# Altium footprint library Conectores GAM.PcbLib: 182 footprints (part 8 of 12)
Each footprint in its own frame and in the unit in brackets; x right, y up, seen from the top. Pads: shape width x height; smd on the part's side, far side on the other; paste and mask are expansions set on the pad; w line width, h text height; cw(c..) or ccw(c..) is an arc to the next point about the centre after c.
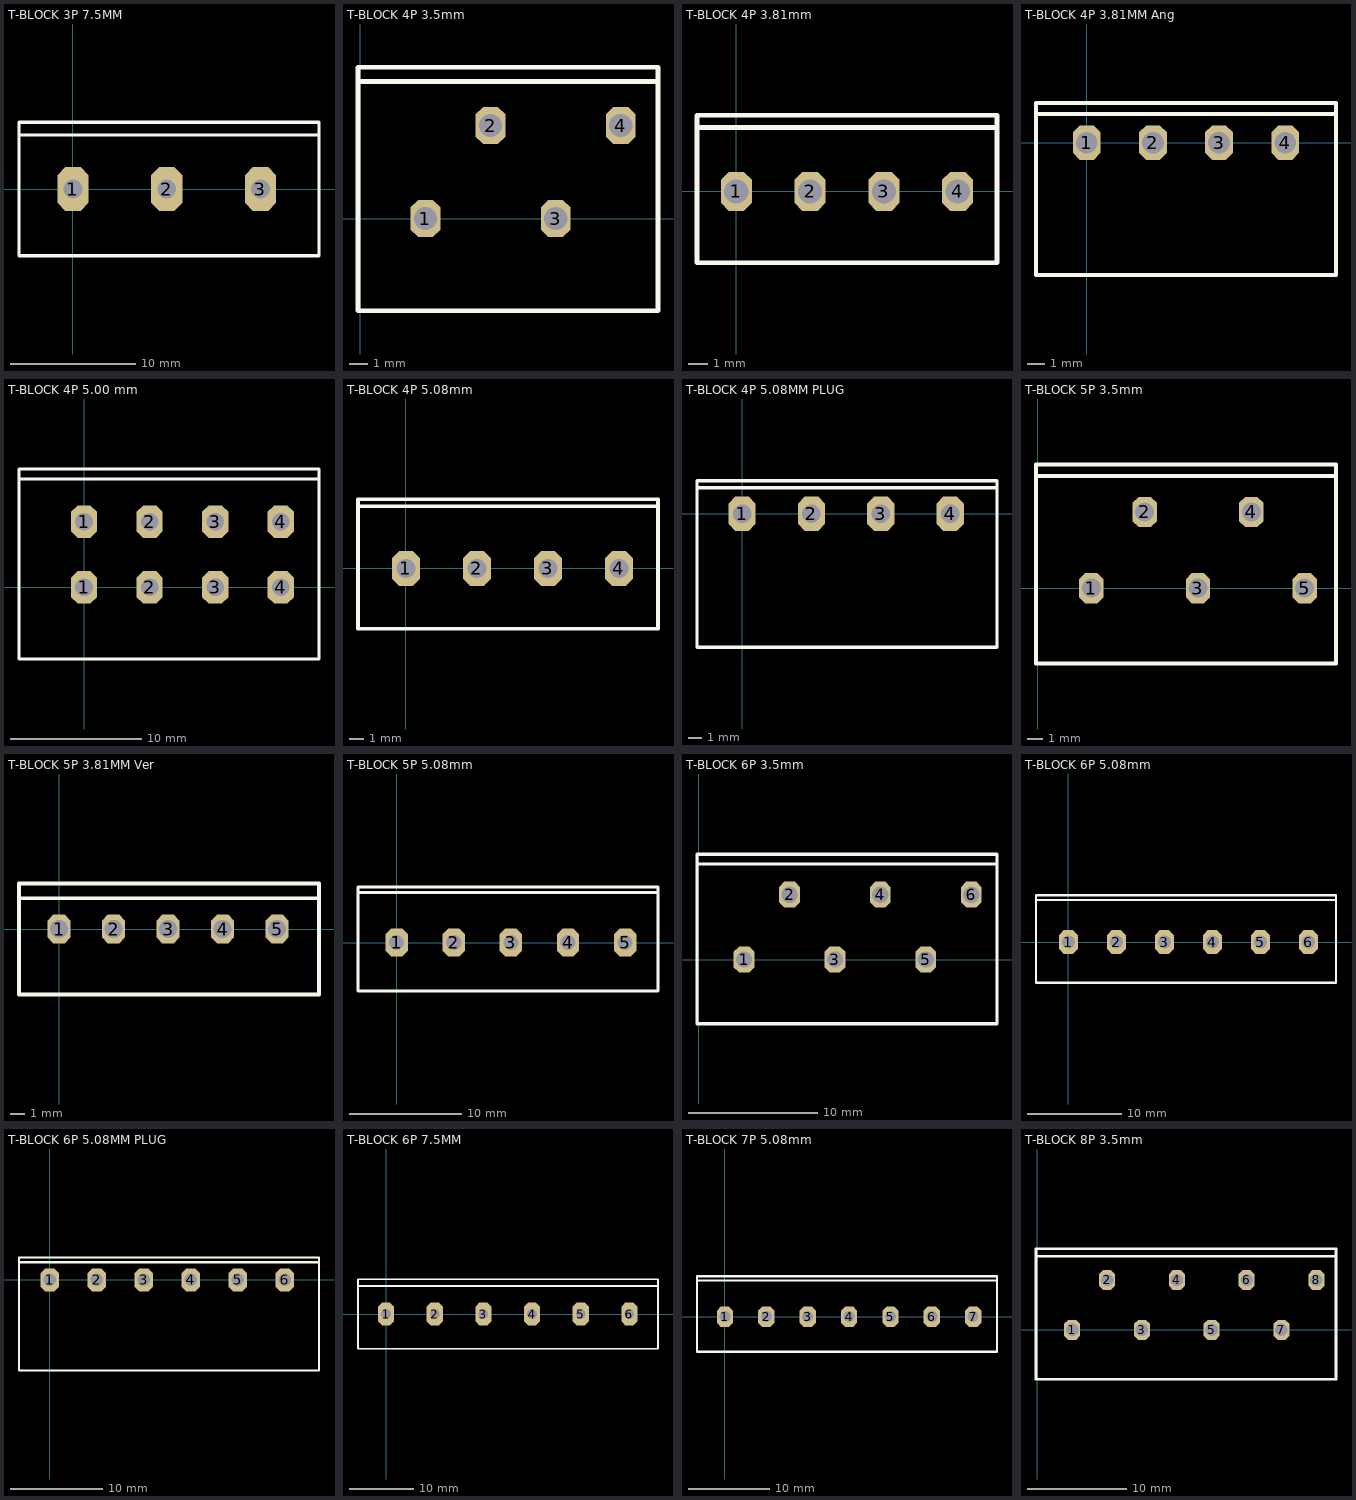
[diagram p7: the footprints below, top view; thin cyan lines are the x and y axes]

## T-BLOCK 3P 7.5MM [mm] "Terminal de Bloque 3P 7.5 mm"
pads (3):
  oct 2.5x3.5 hole 1.5: 1(0,0) 2(7.5,0) 3(15,0)
Top Overlay:
  lines w0.254: -4.191,4.318 19.685,4.318 ; -4.318,-5.334 19.685,-5.334 19.685,5.334 -4.318,5.334 -4.318,-5.334
3D body "Tblock75x3.stp": height 11.8, standoff -3.3, extent -3.75,-3.944 18.75,3.556

## T-BLOCK 4P 3.5mm [mm] "Terminal Block 4P 3.5mm"
pads (4):
  oct 1.6x2 hole 1.25: 1(3.5,0) 2(7,5) 3(10.5,0) 4(14,5)
Top Overlay:
  lines w0.254: -0.127,7.366 16.002,7.366 ; -0.127,-4.953 -0.127,8.128 16.002,8.128 16.002,-4.953 -0.127,-4.953
3D body "TB3.5MM-W691412120004B (rev1).stp": height 13.05, standoff -3.25, extent 0.179,-4.73 15.679,7.27

## T-BLOCK 4P 3.81mm [mm] "Terminal de Bloque 4P 3.81mm"
pads (4):
  oct 1.6x2 hole 1.25: 1(0,0) 2(3.81,0) 3(7.62,0) 4(11.43,0)
Top Overlay:
  lines w0.254: -2.032,3.302 13.462,3.302 ; -2.032,-3.683 -2.032,3.937 13.462,3.937 13.462,-3.683 -2.032,-3.683
3D body "TB381X2.stp": height 8.7, standoff -3.3, extent -1.905,-3.617 5.715,3.683
3D body "TB381X2.stp": height 8.7, standoff -3.3, extent 5.715,-3.617 13.335,3.683

## T-BLOCK 4P 3.81MM Ang [mm] "TERMINAL BLOCK 3.81MM 4P"
pads (4):
  oct 1.6x2 hole 1.25: 1(0,0) 2(3.81,0) 3(7.62,0) 4(11.43,0)
Top Overlay:
  lines w0.254: -2.794,1.651 14.351,1.651 ; -2.921,-7.62 14.351,-7.62 14.351,2.286 -2.921,2.286 -2.921,-7.62
3D body "TB 3.81 3Pa.stp": height 7.8, standoff -3.3, extent -2.286,-17.883 9.144,-2.183
3D body "ph-tb3-381.stp": height 7.25, standoff -3.4, extent -2.6,-7.903 10.22,1.397
3D body "ph-tb3-381.stp": height 7.25, standoff -3.4, extent 1.21,-7.903 14.03,1.397
3D body "TB 3.81 3Pa.stp": height 7.8, standoff -3.3, extent 2.286,-17.883 13.716,-2.183

## T-BLOCK 4P 5.00 mm [mm] "Terminal de Bloque 4P 5mm TE 1-2834014-4"
pads (8):
  oct 2x2.5 hole 1.35: 1(0,0) 1(0,5) 2(5,0) 2(5,5) 3(10,0) 3(10,5) 4(15,0) 4(15,5)
Top Overlay:
  lines w0.254: -4.953,8.255 17.78,8.255 ; -4.953,-5.461 17.907,-5.461 17.907,9.017 -4.953,9.017 -4.953,-5.461
3D body "c-1-2834014-4-1-3d.stp": height 13.35, standoff -3.05, extent -4.523,-5.18 17.477,7.62

## T-BLOCK 4P 5.08mm [mm] "Terminal Block 4P 5.08mm"
pads (4):
  oct 2x2.5 hole 1.35: 1(0,0) 2(5.08,0) 3(10.16,0) 4(15.24,0)
Top Overlay:
  lines w0.254: -3.302,4.445 17.907,4.445 ; -3.429,-4.318 18.034,-4.318 18.034,4.953 -3.429,4.953 -3.429,-4.318
3D body "tb1p.step": height 12.5, standoff -4.4, extent 12.1,-4.119 17.78,4.881
3D body "tb1p.step": height 12.5, standoff -4.4, extent 7.02,-4.119 12.7,4.881
3D body "tb1p.step": height 12.5, standoff -4.4, extent 1.94,-4.119 7.62,4.881
3D body "tb1p.step": height 12.5, standoff -4.4, extent -3.14,-4.119 2.54,4.881

## T-BLOCK 4P 5.08MM PLUG [mm] "Terminal de Bloque 4P 5.08mm 90"
pads (4):
  oct 2x2.5 hole 1.35: 1(0,0) 2(5.08,0) 3(10.16,0) 4(15.24,0)
Top Overlay:
  lines w0.254: -3.175,1.905 18.669,1.905 ; -3.302,-9.779 18.669,-9.779 18.669,2.413 -3.302,2.413 -3.302,-9.779
3D body "TB PlugIn 5.08mm 2PF.step": height 15.75, standoff -3.75, extent -3.26,-19.341 8.34,2.159
3D body: height 0.25, standoff 0, extent 0.127,2.159 0.127,2.159
3D body "TB PlugIn 5.08mm 2PF.step": height 15.75, standoff -3.75, extent 6.9,-19.341 18.5,2.159

## T-BLOCK 5P 3.5mm [mm] "Terminal Block 5P 3.5mm"
pads (5):
  oct 1.6x2 hole 1.25: 1(3.5,0) 2(7,5) 3(10.5,0) 4(14,5) 5(17.5,0)
Top Overlay:
  lines w0.254: -0.127,7.366 19.558,7.366 ; -0.127,-4.953 19.558,-4.953 19.558,8.128 -0.127,8.128 -0.127,-4.953
3D body "TB3.5MM-W691412120005B (rev1).stp": height 13.05, standoff -3.25, extent 0.179,-4.73 19.179,7.27

## T-BLOCK 5P 3.81MM Ver [mm] "TERMINAL BLOCK 3.81MM 5P 691321300005"
pads (5):
  oct 1.6x2 hole 1.25: 1(0,0) 2(3.81,0) 3(7.62,0) 4(11.43,0) 5(15.24,0)
Top Overlay:
  lines w0.254: -2.794,2.159 18.034,2.159 ; -2.794,-4.572 18.161,-4.572 18.161,3.175 -2.794,3.175 -2.794,-4.572
3D body "691321300005 (rev1).stp": height 9.6, standoff -3.1, extent -2.413,-4.362 17.827,2.838

## T-BLOCK 5P 5.08mm [mm] "Terminal Block 5P 5.08mm"
pads (5):
  oct 2x2.5 hole 1.35: 1(0,0) 2(5.08,0) 3(10.16,0) 4(15.24,0) 5(20.32,0)
Top Overlay:
  lines w0.254: -3.302,4.445 23.241,4.445 ; -3.429,-4.318 -3.429,4.953 23.241,4.953 23.241,-4.318 -3.429,-4.318
3D body "tb1p.step": height 12.5, standoff -4.4, extent -3.14,-4.119 2.54,4.881
3D body "tb1p.step": height 12.5, standoff -4.4, extent 1.94,-4.119 7.62,4.881
3D body "tb1p.step": height 12.5, standoff -4.4, extent 7.02,-4.119 12.7,4.881
3D body "tb1p.step": height 12.5, standoff -4.4, extent 12.1,-4.119 17.78,4.881
3D body "tb1p.step": height 12.5, standoff -4.4, extent 17.18,-4.119 22.86,4.881

## T-BLOCK 6P 3.5mm [mm] "Terminal Block 6P 3.5mm"
pads (6):
  oct 1.6x2 hole 1.25: 1(3.5,0) 2(7,5) 3(10.5,0) 4(14,5) 5(17.5,0) 6(21,5)
Top Overlay:
  lines w0.254: -0.127,7.366 22.987,7.366 ; -0.127,-4.953 -0.127,8.128 22.987,8.128 22.987,-4.953 -0.127,-4.953
3D body "TB3.5MM-W691412120006B (rev1).stp": height 13.05, standoff -3.25, extent 0.179,-4.73 22.679,7.27

## T-BLOCK 6P 5.08mm [mm] "Terminal Block 6P 5.08mm"
pads (6):
  oct 2x2.5 hole 1.35: 1(0,0) 2(5.08,0) 3(10.16,0) 4(15.24,0) 5(20.32,0) 6(25.4,0)
Top Overlay:
  lines w0.254: -3.302,4.445 28.321,4.445 ; -3.429,-4.318 -3.429,4.953 28.321,4.953 28.321,-4.318 -3.429,-4.318
3D body "tb1p.step": height 12.5, standoff -4.4, extent -3.14,-4.119 2.54,4.881
3D body "tb1p.step": height 12.5, standoff -4.4, extent 1.94,-4.119 7.62,4.881
3D body "tb1p.step": height 12.5, standoff -4.4, extent 7.02,-4.119 12.7,4.881
3D body "tb1p.step": height 12.5, standoff -4.4, extent 12.1,-4.119 17.78,4.881
3D body "tb1p.step": height 12.5, standoff -4.4, extent 17.18,-4.119 22.86,4.881
3D body "tb1p.step": height 12.5, standoff -4.4, extent 22.26,-4.119 27.94,4.881

## T-BLOCK 6P 5.08MM PLUG [mm] "Terminal de Bloque 6P 5.08mm 90"
pads (6):
  oct 2x2.5 hole 1.35: 1(0,0) 2(5.08,0) 3(10.16,0) 4(15.24,0) 5(20.32,0) 6(25.4,0)
Top Overlay:
  lines w0.254: -3.175,1.905 29.083,1.905 ; -3.302,-9.779 29.083,-9.779 29.083,2.413 -3.302,2.413 -3.302,-9.779
3D body "TB PlugIn 5.08mm 2PF.step": height 15.75, standoff -3.75, extent -3.26,-19.341 8.34,2.159
3D body: height 0.25, standoff 0, extent 0.127,2.159 0.127,2.159
3D body "TB PlugIn 5.08mm 2PF.step": height 15.75, standoff -3.75, extent 6.9,-19.341 18.5,2.159
3D body "TB PlugIn 5.08mm 2PF.step": height 15.75, standoff -3.75, extent 17.06,-19.341 28.66,2.159

## T-BLOCK 6P 7.5MM [mm] "Terminal de Bloque 6P 7.5 mm"
pads (6):
  oct 2.5x3.5 hole 1.5: 1(0,0) 2(7.5,0) 3(15,0) 4(22.5,0) 5(30,0) 6(37.5,0)
Top Overlay:
  lines w0.254: -4.191,4.318 41.91,4.318 ; -4.318,-5.334 41.91,-5.334 41.91,5.334 -4.318,5.334 -4.318,-5.334
3D body "Tblock75x6.stp": height 11.8, standoff -3.3, extent -3.75,-3.944 41.25,3.556

## T-BLOCK 7P 5.08mm [mm] "Terminal Block 7P 5.08mm"
pads (7):
  oct 2x2.5 hole 1.35: 1(0,0) 2(5.08,0) 3(10.16,0) 4(15.24,0) 5(20.32,0) 6(25.4,0) 7(30.48,0)
Top Overlay:
  lines w0.254: -3.302,4.445 33.401,4.445 ; -3.429,-4.318 33.401,-4.318 33.401,4.953 -3.429,4.953 -3.429,-4.318
3D body "tb1p.step": height 12.5, standoff -4.4, extent 22.26,-4.119 27.94,4.881
3D body "tb1p.step": height 12.5, standoff -4.4, extent 17.18,-4.119 22.86,4.881
3D body "tb1p.step": height 12.5, standoff -4.4, extent 12.1,-4.119 17.78,4.881
3D body "tb1p.step": height 12.5, standoff -4.4, extent 7.02,-4.119 12.7,4.881
3D body "tb1p.step": height 12.5, standoff -4.4, extent 1.94,-4.119 7.62,4.881
3D body "tb1p.step": height 12.5, standoff -4.4, extent -3.14,-4.119 2.54,4.881
3D body "tb1p.step": height 12.5, standoff -4.4, extent 27.34,-4.119 33.02,4.881

## T-BLOCK 8P 3.5mm [mm] "Terminal Block 8P 3.5mm"
pads (8):
  oct 1.6x2 hole 1.25: 1(3.5,0) 2(7,5) 3(10.5,0) 4(14,5) 5(17.5,0) 6(21,5) 7(24.5,0) 8(28,5)
Top Overlay:
  lines w0.254: -0.127,7.366 29.972,7.366 ; -0.127,-4.953 -0.127,8.128 29.972,8.128 29.972,-4.953 -0.127,-4.953
3D body "TB3.5MM-W691412120008B (rev1).stp": height 13.05, standoff -3.25, extent 0.179,-4.73 29.679,7.27